# Altium footprint library OT Library.PcbLib: 396 footprints (part 20 of 25)
Each footprint in its own frame and in the unit in brackets; x right, y up, seen from the top. Pads: shape width x height; smd on the part's side, far side on the other; paste and mask are expansions set on the pad; w line width, h text height; cw(c..) or ccw(c..) is an arc to the next point about the centre after c.
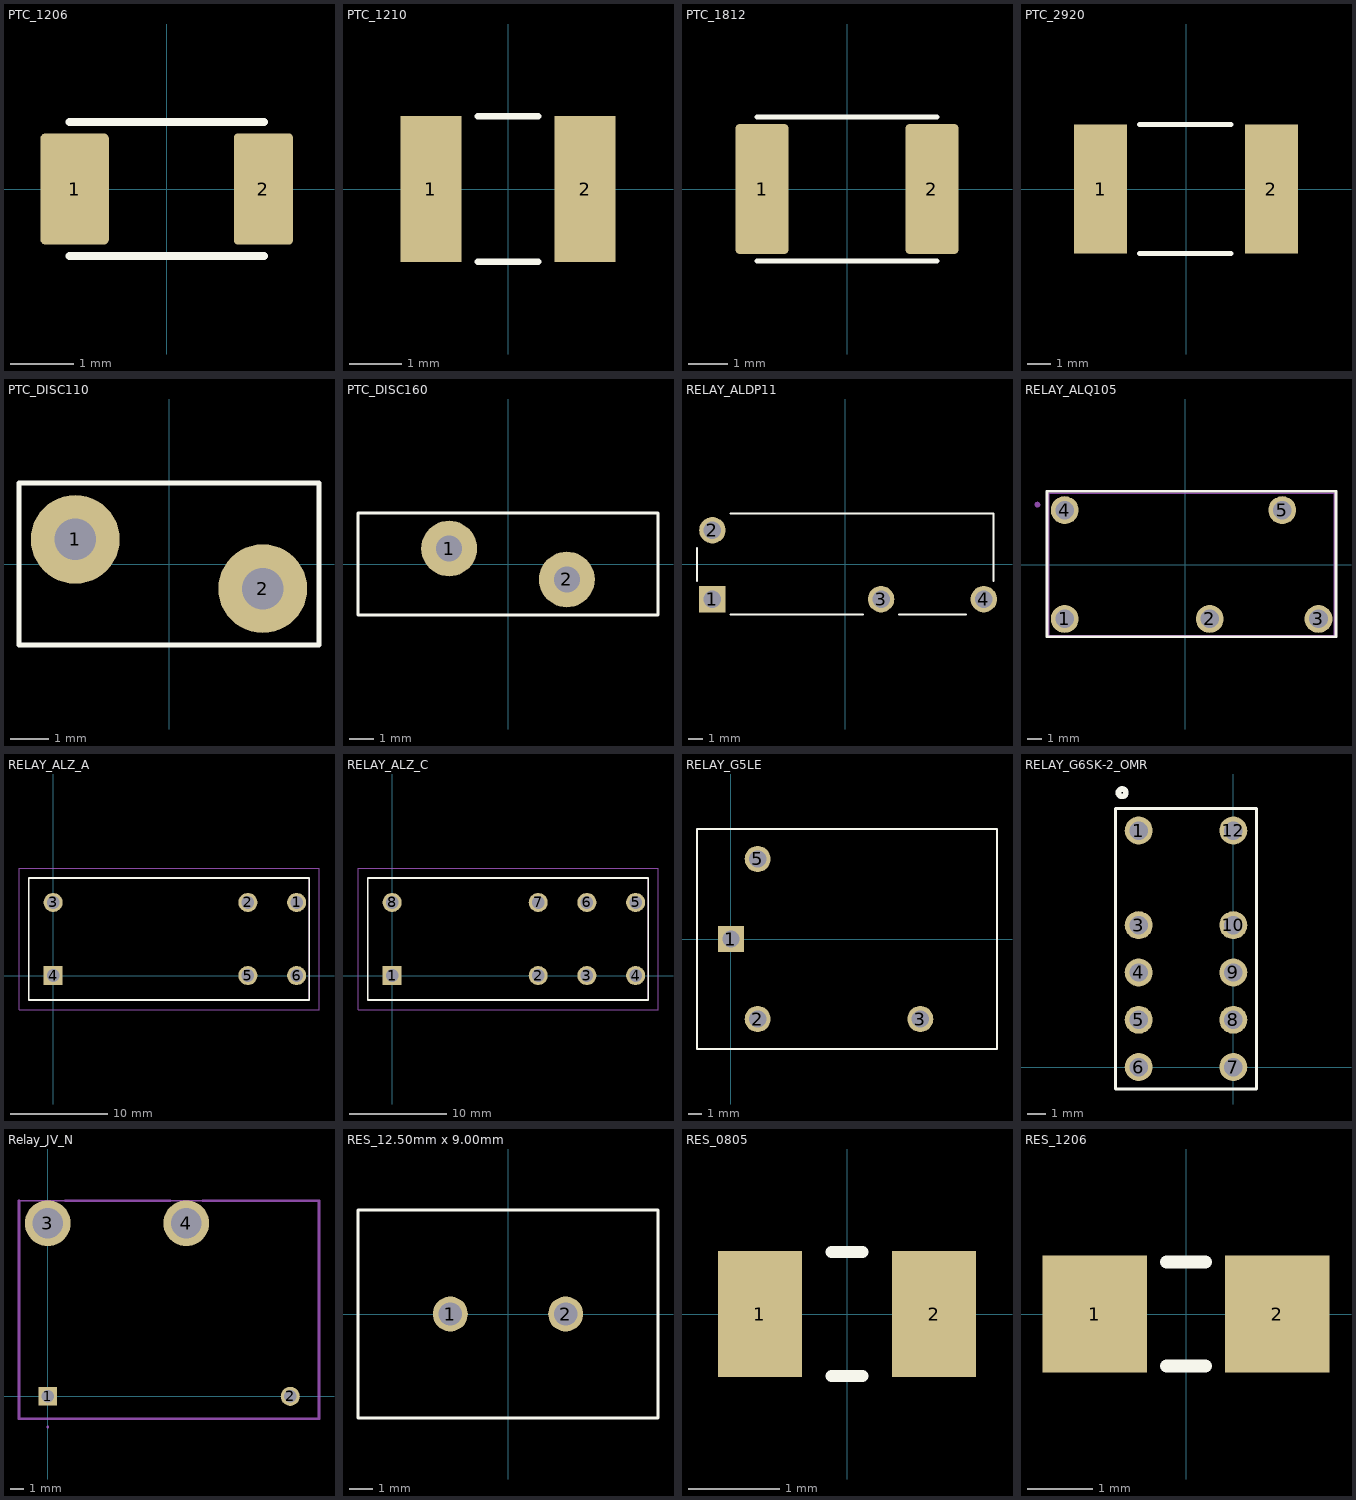
[diagram p19: the footprints below, top view; thin cyan lines are the x and y axes]

## PTC_1206 [mm] "0.126\" L x 0.063\" W (3.20mm x 1.60mm)"
height 1
pads (2):
  rrect14% 1.09x1.77 smd: 1(-1.465,0)
  rrect14% 0.94x1.77 smd: 2(1.54,0)
Top Overlay:
  lines w0.127: -1.55,-1.065 1.55,-1.065 ; -1.55,1.065 1.55,1.065
3D body: height 0.82, standoff -0.03, extent -1.625,-0.825 1.625,0.825

## PTC_1210 [mm] "0.127\" L x 0.102\" W (3.22mm x 2.58mm)"
height 0.85
pads (2):
  rect 1.18x2.81 smd: 1(-1.484,0) 2(1.484,0)
Top Overlay:
  lines w0.127: -0.58,-1.4 0.58,-1.4 ; -0.58,1.4 0.58,1.4
3D body: height 1.2, standoff 0, extent -1.607,-1.287 1.608,1.288

## PTC_1812 [mm] "0.179\" L x 0.128\" W (4.55mm x 3.24mm)"
pads (2):
  rrect15% 1.34x3.29 smd: 1(-2.15,0) 2(2.15,0)
Top Overlay:
  lines w0.127: -2.28,-1.825 2.28,-1.825 ; -2.28,1.825 2.28,1.825
3D Top:
  lines w0.127: -2.37,-0.2 ccw(c-2.37,0) -2.37,0.2 ; 2.37,-0.2 cw(c2.37,0) 2.37,0.2
3D body: height 0.7, standoff 0, extent -2.275,-1.62 2.275,1.62

## PTC_2920 [mm] "2920 SMT PPTC"
pads (2):
  rect 2.3x5.6 smd: 1(-3.7,0) 2(3.7,0)
Top Overlay:
  lines w0.2: -2.032,-2.794 1.968,-2.794 ; -2.032,2.794 1.968,2.794
3D body: height 0.85, standoff -0.85, extent -3.678,-2.56 3.678,2.56

## PTC_DISC110 [mil] "Tyco_RKEF110"
pads (2):
  round 90 hole 42: 1(-95,25) 2(95,-25)
Top Overlay:
  lines w5: -152,-82 -152,82 152,82 152,-82 -152,-82
3D body: height 466.06, standoff -112.28, extent -145.67,-59.11 145.67,59

## PTC_DISC160 [mil] "LittleFuse_RKEF160"
pads (2):
  round 90 hole 42: 1(-95,25) 2(95,-25)
Top Overlay:
  lines w5: -242,-82 242,-82 242,82 -242,82 -242,-82
3D body: height 694.57, standoff -226.89, extent -214,-71.87 215.14,69.87

## RELAY_ALDP11 [mm]
height 14.9
pads (4):
  rect 1.8x1.8 / inner round 1.8 / far side rect 1.8x1.8 hole 1.2 mask+0.102: 1(-9.05,-2.4)
  round 1.8 hole 1.2 mask+0.102: 2(-9.05,2.3) 3(2.45,-2.4) 4(9.45,-2.4)
Top Overlay:
  lines w0.127: -10.1,-1.18 -10.1,1.08 ; -7.83,-3.45 1.23,-3.45 ; -7.83,3.45 10.1,3.45 10.1,-1.18 ; 3.67,-3.45 8.23,-3.45
3D body: height 14.9, standoff -3.4, extent -10.15,-3.5 10.15,3.5

## RELAY_ALQ105 [mm]
pads (5):
  round 1.95 / inner round 1.524 / far side round 1.95 hole 1.3: 1(-8.44,-3.81) 2(1.72,-3.81) 3(9.34,-3.81) 4(-8.44,3.81) 5(6.8,3.81)
Top Overlay:
  lines w0.2: -9.677,-5.055 10.566,-5.055 10.566,5.131 -9.677,5.131 -9.677,-5.055
Mechanical 22:
  lines w0.1: -9.55,-5 10.45,-5 10.45,5 -9.55,5 -9.55,-5
  lines w0.2: -10.35,4.1 ccw(c-10.35,4.2) -10.35,4.3 ccw(c-10.35,4.2) -10.35,4.1
3D body: height 15.8, standoff -4, extent -9.525,-5 10.475,5

## RELAY_ALZ_A [mm]
pads (6):
  round 1.95 hole 1.3: 1(25,7.5) 2(20,7.5) 3(0,7.5) 5(20,0) 6(25,0)
  rect 1.95x1.95 hole 1.3: 4(0,0)
Top Overlay:
  lines w0.2: -2.5,-2.5 -2.5,10 26.3,10 26.3,-2.5 -2.5,-2.5
Courtyard Top:
  lines w0.1: -2.5,-2.5 -2.5,10 26.3,10 26.3,-2.5 -2.5,-2.5
Test Points Bottom:
  lines w0.1: -3.5,-3.5 -3.5,11 27.3,11 27.3,-3.5 -3.5,-3.5
3D body: height 15.7, standoff -3.5, extent -2.6,-2.45 26.2,10.05

## RELAY_ALZ_C [mm]
pads (8):
  rect 1.95x1.95 hole 1.3: 1(0,0)
  round 1.95 hole 1.3: 2(15,0) 3(20,0) 4(25,0) 5(25,7.5) 6(20,7.5) 7(15,7.5) 8(0,7.5)
Top Overlay:
  lines w0.2: -2.5,-2.5 26.3,-2.5 26.3,10 -2.5,10 -2.5,-2.5
Courtyard Top:
  lines w0.1: -2.5,-2.5 26.3,-2.5 26.3,10 -2.5,10 -2.5,-2.5
Test Points Bottom:
  lines w0.1: -3.5,-3.5 27.3,-3.5 27.3,11 -3.5,11 -3.5,-3.5
3D body: height 16.1, standoff -5, extent -2.5,-2.5 26.3,10

## RELAY_G5LE [mm]
pads (4):
  rect 1.95x1.95 hole 1.3: 1(0,0)
  round 1.95 hole 1.3: 2(2,-6) 3(14.2,-6) 5(2,6)
Top Overlay:
  lines w0.127: -2.55,-8.25 19.95,-8.25 19.95,8.25 -2.55,8.25 -2.55,-8.25
3D body: height 19, standoff -3.5, extent -2.55,-8.25 19.95,8.25

## RELAY_G6SK-2_OMR [mil]
pads (10):
  round 59 / inner round 60 / far side round 59 hole 39 paste-29.5 mask+0: 1(-200,500) 3(-200,300) 4(-200,200) 5(-200,100) 6(-200,0) 7(0,0) 8(0,100) 9(0,200) 10(0,300) 12(0,500)
Top Overlay:
  circle w11.81: c-235,580 r7.87
  lines w6: -248.7,-46.34 48.7,-46.34 48.7,546.34 -248.7,546.34 -248.7,-46.34
3D body: height 362.2, standoff -116.14, extent -243.7,-41 43.7,541.68

## Relay_JV_N [mm]
pads (4):
  rect 1.356x1.356 / inner rect 1.524x1.524 / far side rect 1.356x1.356 hole 0.9: 1(0,0)
  round 1.4 / inner round 1.524 / far side round 1.4 hole 0.9: 2(17.78,0)
  round 3.36 / inner round 1.524 / far side round 3.36 hole 2.24: 3(0,12.7) 4(10.16,12.7)
Assembly Top:
  lines w0.1: -2.11,-1.65 -2.11,14.35 19.89,14.35 19.89,-1.65 -2.11,-1.65
Mechanical 22:
  lines w0.1: 0,-2.3 ccw(c0,-2.25) 0,-2.2 ccw(c0,-2.25) 0,-2.3
  lines w0.2: -2.11,14.35 -2.11,-1.65 19.89,-1.65 19.89,14.35 11.39,14.35 ; 1.29,14.35 8.99,14.35
3D body: height 11, standoff -5, extent -2.11,-1.65 19.89,14.35

## RES_12.50mm x 9.00mm [mm] "0.492\" L x 0.354\" W (12.50mm x 9.00mm)"
height 26
pads (2):
  round 1.518 hole 1.01 mask+0.102: 1(-2.5,0) 2(2.5,0)
Top Overlay:
  lines w0.127: -6.5,-4.5 6.5,-4.5 6.5,4.5 -6.5,4.5 -6.5,-4.5
3D body: height 25, standoff -6, extent -6.5,-4.5 6.5,4.5

## RES_0805 [mm]
pads (2):
  rect 0.92x1.38 smd: 1(-0.955,0) 2(0.955,0)
Top Overlay:
  lines w0.127: -0.17,-0.68 0.17,-0.68 ; -0.17,0.68 0.17,0.68
3D body: height 0.6, standoff 0, extent -1,-0.625 1,0.625

## RES_1206 [mm] "Chip Resistor; Body 3.2 x 1.6 mm (LxW typ)"
height 1
pads (2):
  rect 1.6x1.8 smd: 1(-1.4,0) 2(1.4,0)
Top Overlay:
  lines w0.2: -0.3,-0.8 0.3,-0.8 ; -0.3,0.8 0.3,0.8
3D body: height 0.6, standoff 0, extent -1.6,-0.8 1.6,0.8